# Altium footprint library Miscellaneous.PcbLib: 139 footprints (part 2 of 9)
Each footprint in its own frame and in the unit in brackets; x right, y up, seen from the top. Pads: shape width x height; smd on the part's side, far side on the other; paste and mask are expansions set on the pad; w line width, h text height; cw(c..) or ccw(c..) is an arc to the next point about the centre after c.
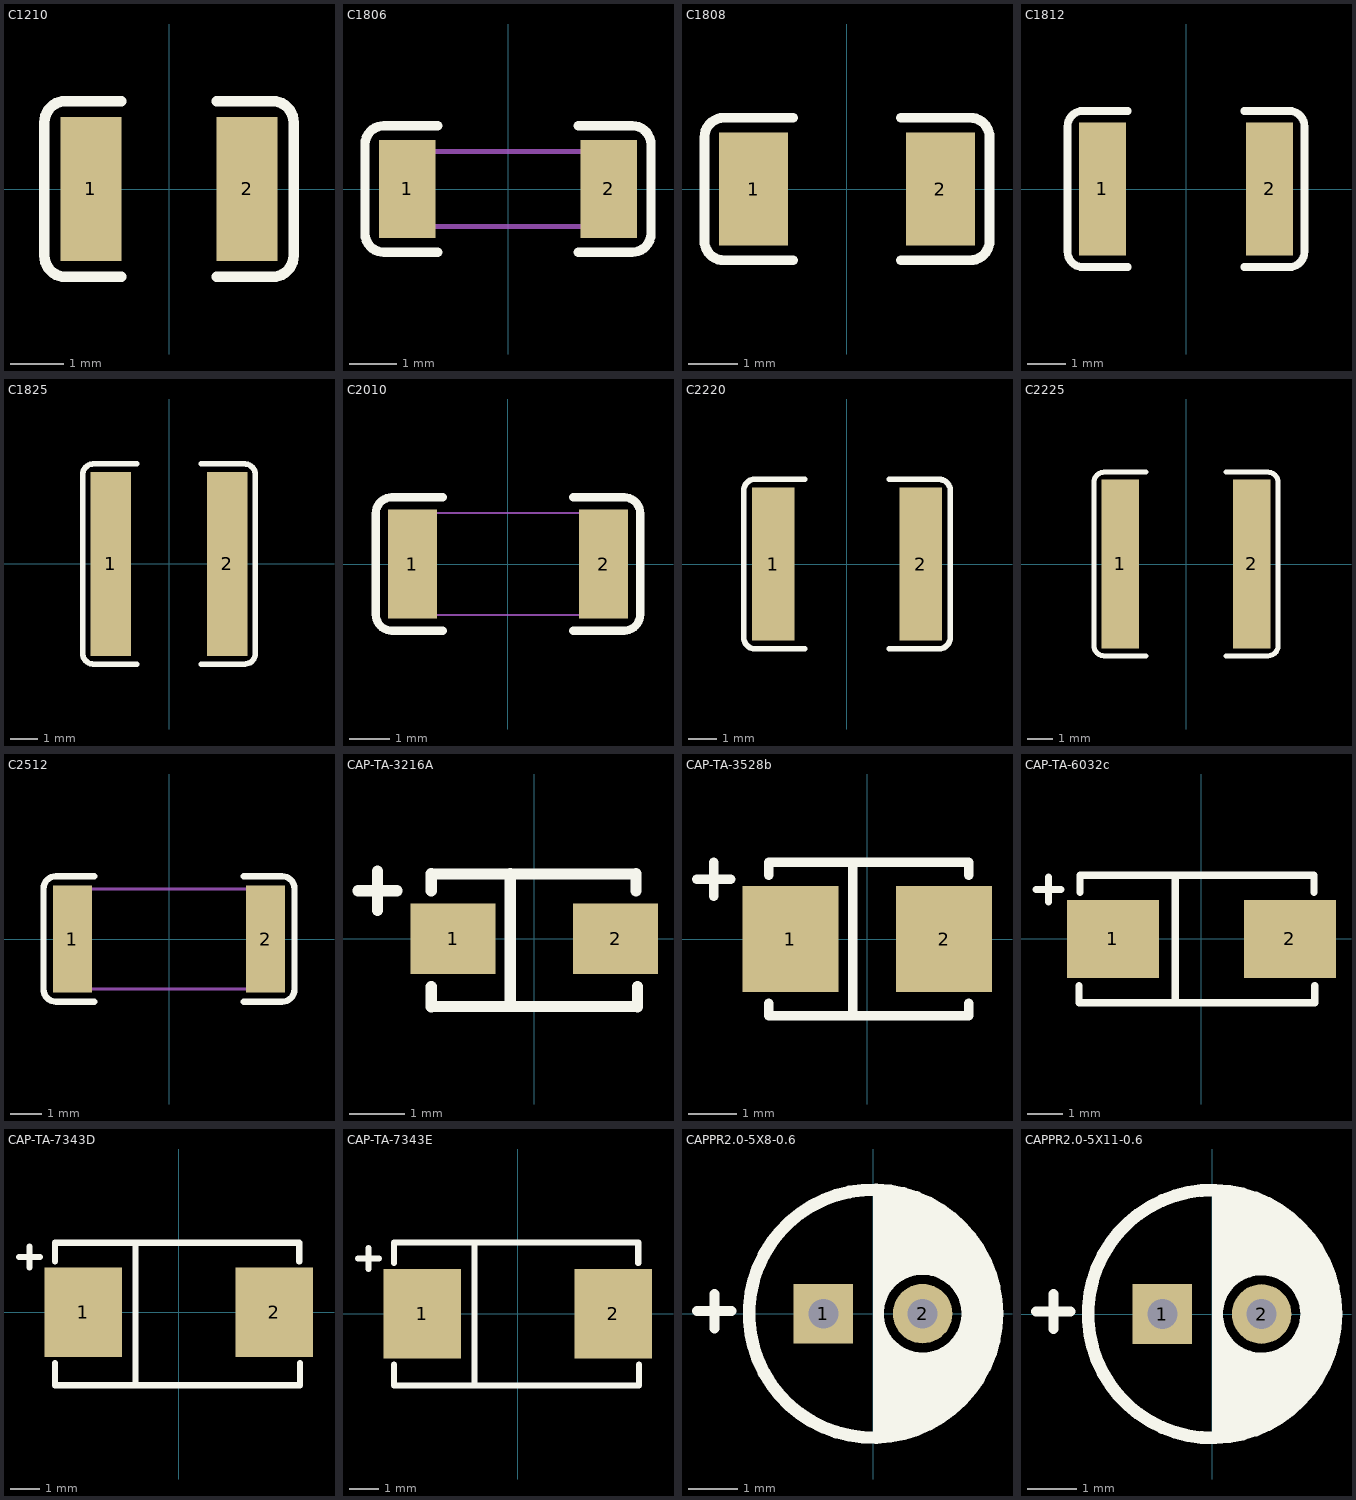
[diagram p1: the footprints below, top view; thin cyan lines are the x and y axes]

## C1210 [mm]
pads (2):
  rect 1.16x2.72 smd: 1(-1.475,0) 2(1.475,0)
Top Overlay:
  lines w0.2: -0.9,-1.66 -1.955,-1.66 cw(c-1.955,-1.26) -2.355,-1.26 -2.355,1.26 cw(c-1.955,1.26) -1.955,1.66 -0.9,1.66 ; 0.9,-1.66 1.955,-1.66 ccw(c1.955,-1.26) 2.355,-1.26 2.355,1.26 ccw(c1.955,1.26) 1.955,1.66 0.9,1.66
3D body "User Library-cap_1210_lowprofile.step": height 1.3, standoff 0, extent -1.6,-1.25 1.6,1.25

## C1806 [mm]
pads (2):
  rect 1.2x2.1 smd: 1(-2.15,0) 2(2.15,0)
Top Overlay:
  lines w0.2: -1.5,-1.35 -2.65,-1.35 cw(c-2.65,-0.95) -3.05,-0.95 -3.05,0.95 cw(c-2.65,0.95) -2.65,1.35 -1.5,1.35 ; 1.5,-1.35 2.65,-1.35 ccw(c2.65,-0.95) 3.05,-0.95 3.05,0.95 ccw(c2.65,0.95) 2.65,1.35 1.5,1.35
Mechanical 13:
  lines w0.1: -2.25,-0.8 2.25,-0.8 2.25,0.8 -2.25,0.8 -2.25,-0.8

## C1808 [mm]
pads (2):
  rect 1.4x2.3 smd: 1(-1.9,0) 2(1.9,0)
Top Overlay:
  lines w0.2: -1.1,-1.45 -2.5,-1.45 cw(c-2.5,-1.05) -2.9,-1.05 -2.9,1.05 cw(c-2.5,1.05) -2.5,1.45 -1.1,1.45 ; 1.1,-1.45 2.5,-1.45 ccw(c2.5,-1.05) 2.9,-1.05 2.9,1.05 ccw(c2.5,1.05) 2.5,1.45 1.1,1.45
3D body "C1808.STEP": height 0.88, standoff -0.02, extent -2.25,-1 2.25,1

## C1812 [mm]
pads (2):
  rect 1.2x3.42 smd: 1(-2.15,0) 2(2.15,0)
Top Overlay:
  lines w0.2: -1.5,-2.01 -2.65,-2.01 cw(c-2.65,-1.61) -3.05,-1.61 -3.05,1.61 cw(c-2.65,1.61) -2.65,2.01 -1.5,2.01 ; 1.5,-2.01 2.65,-2.01 ccw(c2.65,-1.61) 3.05,-1.61 3.05,1.61 ccw(c2.65,1.61) 2.65,2.01 1.5,2.01
3D body "SW3dPS-1812 SMD Capacitor.STEP": height 1.6, standoff 0, extent -2.25,-1.6 2.25,1.6

## C1825 [mm]
pads (2):
  rect 1.5x6.81 smd: 1(-2.15,0) 2(2.15,0)
Top Overlay:
  lines w0.203: -1.2,-3.705 -2.8,-3.705 cw(c-2.8,-3.305) -3.2,-3.305 -3.2,3.305 cw(c-2.8,3.305) -2.8,3.705 -1.2,3.705 ; 1.2,-3.705 2.8,-3.705 ccw(c2.8,-3.305) 3.2,-3.305 3.2,3.305 ccw(c2.8,3.305) 2.8,3.705 1.2,3.705
3D body "User Library-CAPC4564X13.STEP": height 1.3, standoff 0, extent -2.25,-3.2 2.25,3.2

## C2010 [mm]
pads (2):
  rect 1.2x2.67 smd: 1(-2.34,0) 2(2.34,0)
Top Overlay:
  lines w0.2: -1.6,-1.635 -2.84,-1.635 cw(c-2.84,-1.235) -3.24,-1.235 -3.24,1.235 cw(c-2.84,1.235) -2.84,1.635 -1.6,1.635 ; 1.6,-1.635 2.84,-1.635 ccw(c2.84,-1.235) 3.24,-1.235 3.24,1.235 ccw(c2.84,1.235) 2.84,1.635 1.6,1.635
Mechanical 13:
  lines w0.05: -2.5,-1.25 2.5,-1.25 2.5,1.25 -2.5,1.25 -2.5,-1.25

## C2220 [mm]
pads (2):
  rect 1.5x5.42 smd: 1(-2.62,0) 2(2.62,0)
Top Overlay:
  lines w0.2: -1.5,-3.01 -3.27,-3.01 cw(c-3.27,-2.61) -3.67,-2.61 -3.67,2.61 cw(c-3.27,2.61) -3.27,3.01 -1.5,3.01 ; 1.5,-3.01 3.27,-3.01 ccw(c3.27,-2.61) 3.67,-2.61 3.67,2.61 ccw(c3.27,2.61) 3.27,3.01 1.5,3.01
3D body "User Library-CAPC5750X23.STEP": height 2.3, standoff 0, extent -2.85,-2.5 2.85,2.5

## C2225 [mm]
pads (2):
  rect 1.5x6.72 smd: 1(-2.62,0) 2(2.62,0)
Top Overlay:
  lines w0.2: -1.6,-3.66 -3.27,-3.66 cw(c-3.27,-3.26) -3.67,-3.26 -3.67,3.26 cw(c-3.27,3.26) -3.27,3.66 -1.6,3.66 ; 1.6,-3.66 3.27,-3.66 ccw(c3.27,-3.26) 3.67,-3.26 3.67,3.26 ccw(c3.27,3.26) 3.27,3.66 1.6,3.66
3D body "User Library-CAPC5764X13.STEP": height 1.3, standoff 0, extent -2.85,-3.175 2.85,3.175

## C2512 [mm]
pads (2):
  rect 1.25x3.42 smd: 1(-3.1,0) 2(3.1,0)
Top Overlay:
  lines w0.203: -2.4,-2.01 -3.625,-2.01 cw(c-3.625,-1.61) -4.025,-1.61 -4.025,1.61 cw(c-3.625,1.61) -3.625,2.01 -2.4,2.01 ; 2.4,-2.01 3.625,-2.01 ccw(c3.625,-1.61) 4.025,-1.61 4.025,1.61 ccw(c3.625,1.61) 3.625,2.01 2.4,2.01
Mechanical 13:
  lines w0.1: -3.15,-1.6 -3.15,1.6 3.15,1.6 3.15,-1.6 -3.15,-1.6

## CAP-TA-3216A [mil]
pads (2):
  rect 60x50 smd: 1(-57.5,0) 2(57.5,0)
Top Overlay:
  lines w7.87: -73,-48 27.5,-48 73,-48 ; -73,46 23.5,46 72,46
  lines w8: -124.78,34 -111,34 ; -111,20.22 -111,34 ; -111,47.78 -111,34 ; -97.22,34 -111,34 ; -73,-48 -73,-34 ; -73,34 -73,46 ; -17,-45 -17,46 ; 72,34 72,46 ; 73,-48 73,-34
3D body "User Library-AVX_ACASE.step": height 67.32, standoff 0, extent -66.92,-34.07 66.94,32.08

## CAP-TA-3528b [mm]
pads (2):
  rect 2x2.2 smd: 1(-1.6,0) 2(1.6,0)
Top Overlay:
  lines w0.203: -3.547,1.244 -3.197,1.244 ; -3.197,0.894 -3.197,1.244 ; -3.197,1.594 -3.197,1.244 ; -2.847,1.244 -3.197,1.244 ; -2.054,-1.337 -2.054,-1.6 2.112,-1.6 2.112,-1.337 ; -2.054,1.33 -2.054,1.6 2.112,1.6 ; -0.305,-1.565 -0.305,1.559 ; 2.112,1.33 2.112,1.584
3D body "User Library-AVX_BCASE.step": height 2.03, standoff 0, extent -1.825,-1.465 1.876,1.465

## CAP-TA-6032c [mm]
pads (2):
  rect 2.6x2.2 smd: 1(-2.5,0) 2(2.5,0)
Top Overlay:
  lines w0.203: -4.668,1.397 -4.318,1.397 ; -4.318,1.047 -4.318,1.397 ; -4.318,1.747 -4.318,1.397 ; -3.968,1.397 -4.318,1.397 ; -3.454,-1.321 -3.454,-1.8 3.2,-1.8 3.2,-1.321 ; -3.429,1.321 -3.429,1.8 3.175,1.8 3.175,1.321 ; -0.737,-1.802 -0.737,1.698
3D body "User Library-AVX_C_CASE.step": height 2.7, standoff 0, extent -3.202,-1.675 2.898,1.675

## CAP-TA-7343D [mm]
pads (2):
  rect 2.6x3 smd: 1(-3.2,0) 2(3.2,0)
Top Overlay:
  lines w0.203: -5.354,1.854 -5.004,1.854 ; -5.004,1.504 -5.004,1.854 ; -5.004,2.204 -5.004,1.854 ; -4.654,1.854 -5.004,1.854 ; -4.14,-1.702 -4.14,-2.438 4.064,-2.438 4.064,-1.702 ; -4.14,1.702 -4.14,2.337 4.039,2.337 4.039,1.702 ; -1.448,-2.413 -1.448,2.286
3D body "User Library-AVX_D_CASE.step": height 3.01, standoff 0, extent -3.725,-2.276 3.675,2.174

## CAP-TA-7343E [mm]
pads (2):
  rect 2.6x3 smd: 1(-3.2,0) 2(3.2,0)
Top Overlay:
  lines w0.203: -5.354,1.854 -5.004,1.854 ; -5.004,1.504 -5.004,1.854 ; -5.004,2.204 -5.004,1.854 ; -4.654,1.854 -5.004,1.854 ; -4.14,-1.702 -4.14,-2.413 4.064,-2.413 4.064,-1.702 ; -4.14,1.702 -4.14,2.388 4.039,2.388 4.039,1.702 ; -1.448,-2.388 -1.448,2.311
3D body "User Library-AVX_E_CASE.step": height 4.2, standoff 0, extent -3.725,-2.225 3.676,2.225

## CAPPR2.0-5X8-0.6 [mm]
pads (2):
  rect 1.2x1.2 hole 0.6: 1(-1,0)
  round 1.2 hole 0.6: 2(1,0)
Top Overlay:
  circle w0.254: c0,0 r2.5
  circle w0.203: c1,0 r0.885
  region: 0,0 0.127,0 0.131,-0.087 0.165,-0.258 0.232,-0.419 0.329,-0.564 0.452,-0.687 0.597,-0.784 0.758,-0.851 0.929,-0.885 1.016,-0.889 1.101,-0.885 1.268,-0.852 1.426,-0.786 1.568,-0.692 1.688,-0.571 1.783,-0.429 1.848,-0.272 1.881,-0.105 1.885,-0.02 1.885,0 2.5,0 2.5,-0.015 2.5,-0.261 2.404,-0.744 2.215,-1.199 1.942,-1.608 1.594,-1.956 1.184,-2.23 0.729,-2.419 0.246,-2.515 0,-2.515
  region: 0,0 0.127,0 0.127,0.025 0.131,0.108 0.163,0.269 0.226,0.421 0.317,0.557 0.433,0.673 0.57,0.765 0.722,0.828 0.883,0.86 0.965,0.864 1.022,0.864 1.106,0.859 1.273,0.826 1.429,0.762 1.57,0.668 1.689,0.548 1.783,0.407 1.848,0.251 1.881,0.085 1.885,0 1.885,-0.015 2.5,-0.015 2.5,-0.011 2.5,0.235 2.404,0.718 2.215,1.173 1.942,1.583 1.594,1.931 1.184,2.205 0.729,2.393 0.246,2.489 0,2.489
  lines w0.203: -3.55,0.05 -3.2,0.05 ; -3.2,-0.3 -3.2,0.05 ; -3.2,0.4 -3.2,0.05 ; -2.85,0.05 -3.2,0.05
3D body "3.0.STEP": height 8, standoff -1.28, extent -2.5,-2.5 2.5,2.499

## CAPPR2.0-5X11-0.6 [mm]
pads (2):
  rect 1.2x1.2 hole 0.6: 1(-1,0)
  round 1.2 hole 0.6: 2(1,0)
Top Overlay:
  circle w0.254: c0,0 r2.5
  circle w0.203: c1,0 r0.881
  region: 0,-2.515 0,0 0.127,0 0.131,-0.087 0.165,-0.258 0.232,-0.419 0.329,-0.564 0.452,-0.687 0.597,-0.784 0.758,-0.851 0.929,-0.885 1.016,-0.889 1.101,-0.885 1.267,-0.852 1.424,-0.787 1.565,-0.693 1.685,-0.573 1.779,-0.432 1.844,-0.275 1.877,-0.109 1.881,-0.024 1.881,0 2.5,0 2.5,-0.015 2.5,-0.261 2.404,-0.744 2.215,-1.199 1.942,-1.608 1.594,-1.956 1.184,-2.23 0.729,-2.419 0.246,-2.515
  region: 0,0 0.127,0 0.127,0.051 0.131,0.133 0.163,0.294 0.226,0.446 0.317,0.583 0.433,0.699 0.57,0.79 0.722,0.853 0.883,0.885 0.965,0.889 0.992,0.889 1.079,0.885 1.25,0.851 1.411,0.784 1.556,0.687 1.679,0.564 1.776,0.419 1.843,0.258 1.877,0.087 1.881,0 1.881,-0.007 2.5,-0.007 2.5,0.015 2.5,0.261 2.404,0.744 2.215,1.199 1.942,1.608 1.594,1.956 1.184,2.23 0.729,2.419 0.246,2.515 0,2.515
  lines w0.203: -3.55,0.05 -3.2,0.05 ; -3.2,-0.3 -3.2,0.05 ; -3.2,0.4 -3.2,0.05 ; -2.85,0.05 -3.2,0.05
3D body "User Library-Cap electro 5x11x2mm.step": height 11.33, standoff -3.47, extent -2.525,-2.54 2.525,2.511